# Altium footprint library mastermind.PCBLIB: 1061 footprints (part 61 of 67)
Each footprint in its own frame and in the unit in brackets; x right, y up, seen from the top. Pads: shape width x height; smd on the part's side, far side on the other; paste and mask are expansions set on the pad; w line width, h text height; cw(c..) or ccw(c..) is an arc to the next point about the centre after c.
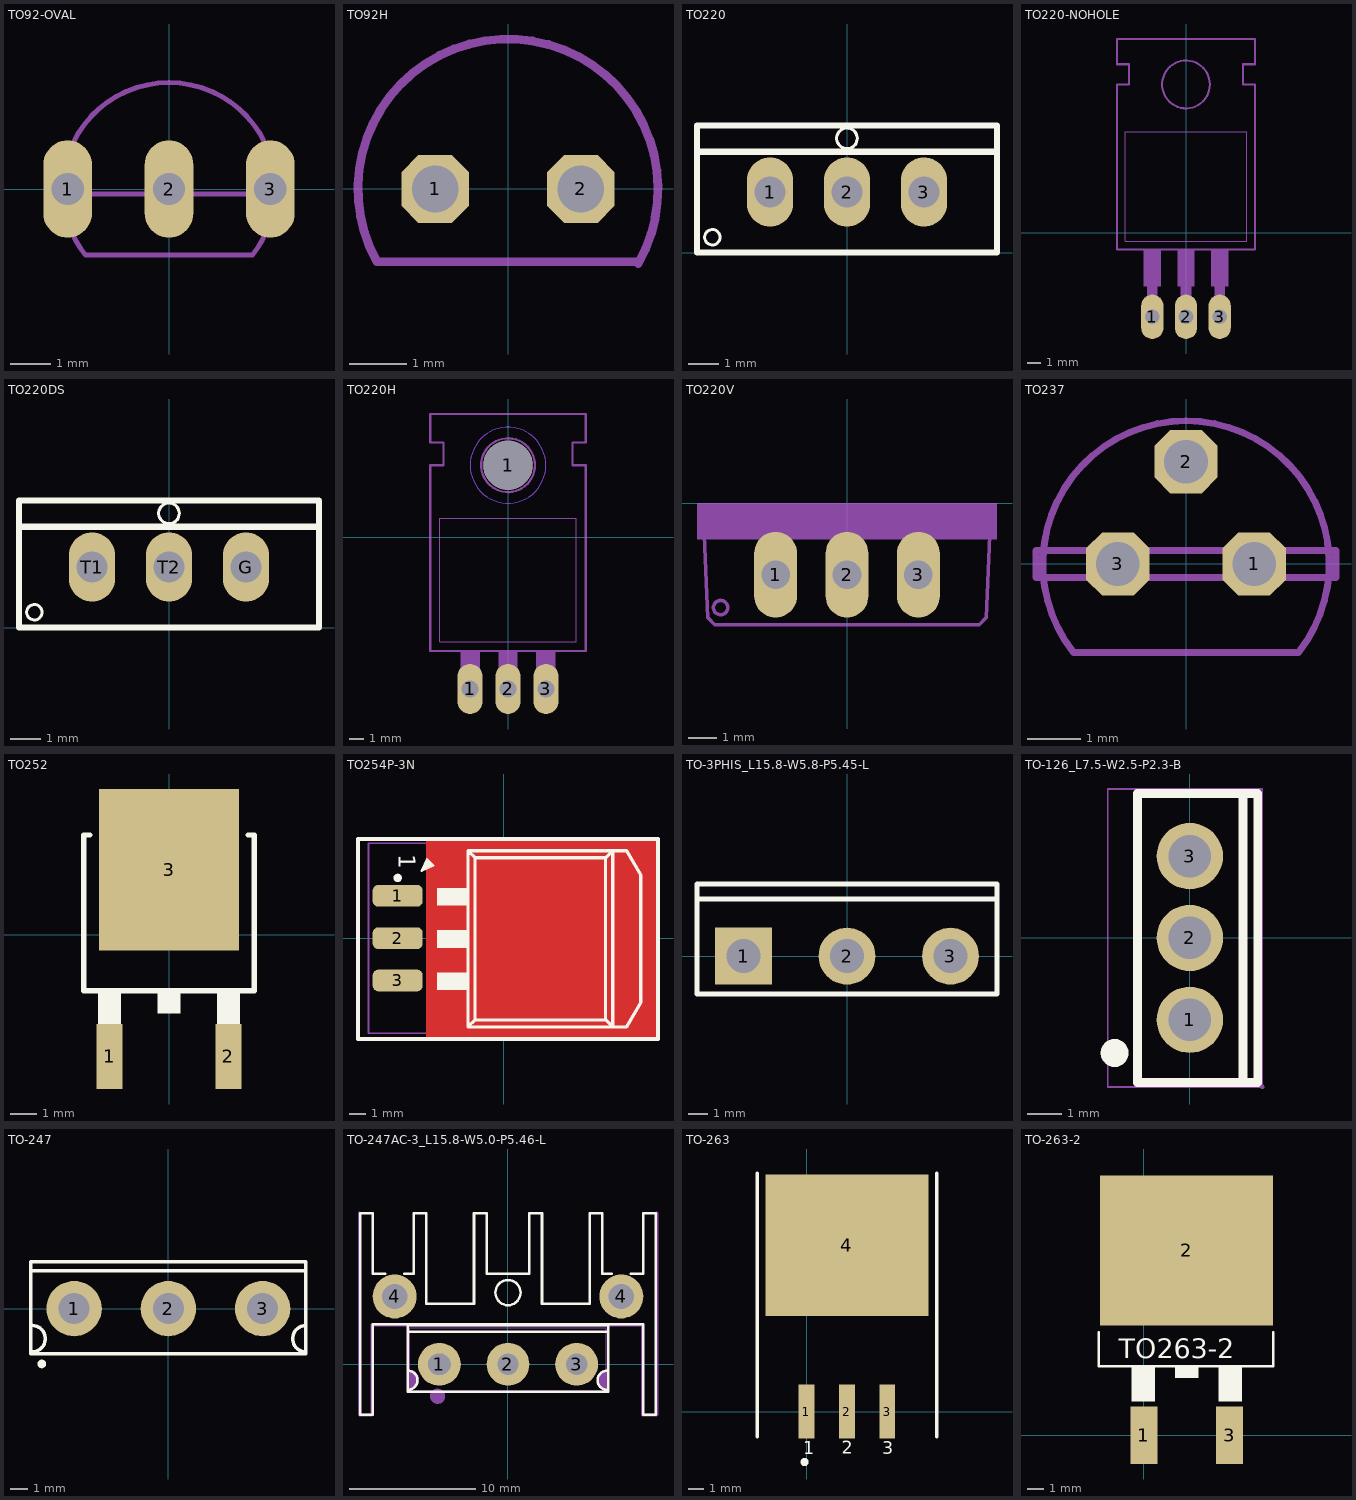
[diagram p60: the footprints below, top view; thin cyan lines are the x and y axes]

## TO92-OVAL [mil]
pads (3):
  oval 48x96 hole 32: 1(-100,0) 2(0,0) 3(100,0)
Mechanical 2:
  lines w5: -95.02,-44.72 ccw(c-0.02,0.01) -82.48,-65 82.48,-65 ccw(c0.01,0) 95.46,-43.77 ; -95,44.72 cw(c0,0) 95,44.72 ; -55.28,-5 -44.72,-5 ; 44.72,-5 55.28,-5
Mechanical 8:
  lines w5: -104.88,-5 -55.28,-5 ; -95,-44.72 cw(c0,0) -95,44.72 ; -44.72,-5 44.72,-5 ; 55.28,-5 104.88,-5 ; 95,-44.72 ccw(c0,0) 95,44.72

## TO92H [mil]
pads (2):
  oct 46.48x46.48 hole 32: 1(-50,0) 2(50,0)
Mechanical 2:
  lines w6: 89.39,-51.08 ccw(c0,0) -90,-50 90,-50

## TO220 [mil]
pads (3):
  oval 60x90 hole 40: 1(-100,78.74) 2(0,78.74) 3(100,78.74)
Top Overlay:
  circle w3.94: c-175,20 r10
  circle w3.94: c0,148.5 r13.39
  lines w7.87: -192.91,131.1 192.91,131.1 ; -194.88,0 194.88,0 194.88,165.35 -194.88,165.35 -194.88,0
3D body "TO220ShortLegs.STEP": height 767.72, standoff -137.8, extent -203.15,0 203.15,171.26

## TO220-NOHOLE [mil]
pads (3):
  oval 66x132 hole 44: 1(-100,-250) 2(0,-250) 3(100,-250)
Mechanical 2:
  circle w6: c0,440 r71
  region: 85,-185 85,-160 115,-160 115,-185
  region: -15,-185 -15,-160 15,-160 15,-185
  region: -115,-185 -115,-160 -85,-160 -85,-185
  region: -125,-160 -125,-50 -75,-50 -75,-160
  region: -25,-160 -25,-50 25,-50 25,-160
  region: 75,-160 75,-50 125,-50 125,-160
  lines w2: -180,-25 180,-25 180,300 -180,300 -180,-25
  lines w6: -205,-50 205,-50 205,440 170,440 170,500 205,500 205,575 -205,575 -205,500 -170,500 -170,440 -205,440 -205,-50
Mechanical 8:
  region: -115,-260 -115,-185 -85,-185 -85,-260
  region: -15,-260 -15,-185 15,-185 15,-260
  region: 85,-260 85,-185 115,-185 115,-260

## TO220DS [mil]
pads (3):
  oval 60x90 hole 40: G(100,78.74) T1(-100,78.74) T2(0,78.74)
Top Overlay:
  circle w3.94: c0,148.5 r13.39
  circle w3.94: c-175,20 r10
  lines w7.87: -192.91,131.1 192.91,131.1 ; -194.88,0 -194.88,165.35 194.88,165.35 194.88,0 -194.88,0
3D body "HeatsinkTO220 (1).step": height 787.4, standoff 0, extent -295.28,3.94 295.28,437.01

## TO220H [mil]
pads (4):
  oval 66x132 hole 44: 1(-100,-400) 2(0,-400) 3(100,-400)
  round 130 hole 130: 1(0,190)
Top Layer keep-out:
  circle w0: c0,190 r100
Bottom Layer keep-out:
  circle w0: c0,190 r100
Mechanical 2:
  circle w6: c0,190 r71
  region: 85,-435 85,-410 115,-410 115,-435
  region: -15,-435 -15,-410 15,-410 15,-435
  region: -115,-435 -115,-410 -85,-410 -85,-435
  region: -125,-410 -125,-300 -75,-300 -75,-410
  region: -25,-410 -25,-300 25,-300 25,-410
  region: 75,-410 75,-300 125,-300 125,-410
  lines w2: -180,-275 180,-275 180,50 -180,50 -180,-275
  lines w6: -205,-300 205,-300 205,190 170,190 170,250 205,250 205,325 -205,325 -205,250 -170,250 -170,190 -205,190 -205,-300

## TO220V [mil]
pads (3):
  oval 60x120 hole 40: 1(-100,-100) 2(0,-100) 3(100,-100)
Mechanical 2:
  circle w5: c-177,-146 r10
  region: -210,-30 -210,0 210,0 210,-30
  region: -210,-50 -210,-30 -135,-30 -135,-50
  region: -65,-50 -65,-30 -35,-30 -35,-50
  region: 35,-50 35,-30 65,-30 65,-50
  region: 135,-50 135,-30 210,-30 210,-50
  lines w5: -200,-45 -195,-160 -185,-170 185,-170 195,-160 200,-45
Mechanical 8:
  region: -135,-50 -135,-30 -65,-30 -65,-50
  region: -35,-50 -35,-30 35,-30 35,-50
  region: 65,-50 65,-30 135,-30 135,-50

## TO237 [mil]
pads (3):
  oct 46.48x46.48 hole 32: 1(50,0) 2(0,75) 3(-50,0)
Mechanical 2:
  lines w5: -30.96,100.33 ccw(c0,0) -82.46,-65 82.46,-65 ccw(c0,0) 30.96,100.33 ; -110,-10 110,-10 110,10 -110,10 -110,-10
Mechanical 8:
  lines w5: -30.96,100.33 cw(c0,-0.02) 30.96,100.33

## TO252 [mm]
pads (3):
  rect 1x2.5 smd: 1(-2.28,-4.681) 2(2.28,-4.681)
  rect 5.4x6.2 smd: 3(0,2.5)
Top Overlay:
  region: -0.432,-3.023 -0.432,-2.261 0.432,-2.261 0.432,-3.023
  region: 1.854,-3.683 1.854,-2.261 2.718,-2.261 2.718,-3.683
  region: -2.718,-3.683 -2.718,-2.261 -1.854,-2.261 -1.854,-3.683
  lines w0.203: -3.048,3.835 -3.277,3.835 -3.277,-2.159 3.277,-2.159 3.277,3.835 3.048,3.835
3D body "User Library-TO252-2.STEP": height 2.29, standoff 0, extent -3.29,-5.028 3.29,4.912

## TO254P-3N [mm]
pads (3):
  rrect50% 3x1.3 smd: 1(-6.35,2.54) 2(-6.35,0) 3(-6.35,-2.54)
Top Layer:
  region: -4.639,5.949 -4.639,-6.051 9.253,-6.051 9.253,5.949
Top Overlay:
  circle w0.25: c-6.35,3.615 r0.125
  region: -3.988,3.023 -3.988,1.956 -2.108,1.956 -2.108,3.023
  region: -3.988,-2.057 -3.988,-3.124 -2.108,-3.124 -2.108,-2.057
  region: -3.988,0.483 -3.988,-0.584 -2.108,-0.584 -2.108,0.483
  lines w0.127: -4.919,4.028 -4.208,4.358 -4.4,4.547 ; -4.919,4.028 -4.589,4.739 -4.4,4.547 ; -4.919,4.028 -4.4,4.547
  lines w0.178: -4.716,4.383 -4.538,4.561 ; -4.564,4.231 -4.386,4.409
  lines w0.2: -2.134,-5.329 -2.134,5.254 ; -2.134,-5.329 6.545,-5.329 ; -2.134,-5.329 -1.71,-4.906 ; -2.134,5.254 6.545,5.254 ; -2.134,5.254 -1.71,4.831 ; -1.71,-4.906 6.121,-4.906 ; -1.71,-4.906 -1.71,4.831 ; -1.71,4.831 6.121,4.831 ; 6.121,-4.906 6.121,4.831 ; 6.121,-4.906 6.545,-5.329 ; 6.121,4.831 6.545,5.254 ; 6.545,-5.329 6.545,5.254 ; 6.545,-5.329 7.366,-5.329 8.238,-3.847 8.238,3.773 7.366,5.254 6.545,5.254
  lines w0.254: -8.731,-6.051 9.269,-6.051 9.269,5.949 -8.731,5.949 -8.731,-6.051
  text "1" at -6.299,5.026 h1
Top Paste:
  region: -0.431,3.773 -0.431,-3.847 7.595,-3.847 7.595,3.773
Top Solder:
  region: -2.413,5.5 -2.413,-5.625 8.179,-5.625 8.179,5.5
  lines w0.254: 8.554,-3.938 8.131,-5.419 ; 8.554,3.863 8.131,5.344 ; -2.462,-5.329 ccw(c-2.134,-5.329) -2.134,-5.658 ; -2.462,-5.329 ccw(c-2.134,-5.329) -2.134,-5.658 ; -2.462,-5.329 -2.462,5.254 ; -2.462,5.254 cw(c-2.134,5.254) -2.134,5.583 ; -2.462,5.254 cw(c-2.134,5.254) -2.134,5.583 ; -2.134,-5.658 6.545,-5.658 7.815,-5.658 ; -2.134,5.583 6.545,5.583 7.815,5.583 ; 7.815,-5.658 ccw(c7.815,-5.329) 8.131,-5.42 ; 7.815,-5.658 ccw(c7.815,-5.329) 8.131,-5.42 ; 7.815,5.583 cw(c7.815,5.254) 8.131,5.345 ; 7.815,5.583 cw(c7.815,5.254) 8.131,5.345 ; 8.567,-3.847 cw(c8.238,-3.847) 8.554,-3.938 ccw(c8.238,-3.847) 8.567,-3.847 ; 8.567,-3.847 8.567,3.773 ; 8.567,3.773 ccw(c8.238,3.773) 8.554,3.863 cw(c8.238,3.773) 8.567,3.773
  lines w0.508: 8.196,-4.669 8.196,4.577
Mechanical 13:
  lines w0.1: -2.675,-4.985 -2.675,4.985 6.475,4.985 6.475,-4.985 -2.675,-4.985
Mechanical 15:
  lines w0.1: -0.5,0 0.5,0 ; 0,-0.5 0,0.5 ; -8.1,-5.7 -8.1,5.7 8.1,5.7 8.1,-5.7 -8.1,-5.7
3D body "254-3.STEP": height 2.53, standoff -0.02, extent -7.339,-5.087 8.101,5.08

## TO-3PHIS_L15.8-W5.8-P5.45-L [mm]
pads (3):
  rect 3x3 hole 1.8 paste-2539.97 mask+0.051: 1(-5.451,0)
  round 3 hole 1.8 paste-2539.97 mask+0.051: 2(0,0) 3(5.451,0)
Top Overlay:
  lines w0.254: -7.9,3 7.9,3 ; -7.9,-2 7.9,-2 7.9,3.8 -7.9,3.8 -7.9,-2

## TO-126_L7.5-W2.5-P2.3-B [mil]
pads (3):
  round 75 hole 48 paste-99999 mask+2: 1(0,-92.52) 2(0,0) 3(0,92.52)
Top Overlay:
  lines w10: 60,-160 60,160 ; -59.05,-163.38 76.78,-163.38 76.78,163.39 -59.05,163.39 -59.05,-163.38
  lines w15.75: -77.12,-130.05 cw(c-85,-130) -77.12,-129.95
Mechanical 15:
  region: 20.06,92.52 20.06,96.51 17.01,103.88 11.36,109.53 3.99,112.58 -3.99,112.58 -11.37,109.53 -17.01,103.88 -20.06,96.51 -20.06,92.52 -20.06,88.53 -17.01,81.15 -11.36,75.51 -3.99,72.46 3.99,72.46 11.37,75.51 17.01,81.16 20.06,88.53
  region: 20.06,0 20.06,3.99 17.01,11.36 11.36,17.01 3.99,20.06 -3.99,20.06 -11.37,17.01 -17.01,11.36 -20.06,3.99 -20.06,0 -20.06,-3.99 -17.01,-11.37 -11.36,-17.01 -3.99,-20.06 3.99,-20.06 11.37,-17.01 17.01,-11.36 20.06,-3.99
  region: 20.06,-92.52 20.06,-88.53 17.01,-81.16 11.36,-75.51 3.99,-72.46 -3.99,-72.46 -11.37,-75.51 -17.01,-81.16 -20.06,-88.53 -20.06,-92.52 -20.06,-96.51 -17.01,-103.89 -11.36,-109.53 -3.99,-112.58 3.99,-112.58 11.37,-109.53 17.01,-103.88 20.06,-96.51
  region: 84.14,-168.38 84.14,-167.4 82.76,-166.02 80.8,-166.02 79.42,-167.4 79.42,-168.38 79.42,-169.36 80.8,-170.74 82.76,-170.74 84.14,-169.36
  lines w2: -92.87,-168.38 81.78,-168.38 81.78,168.39 -92.87,168.39 -92.87,-168.38
3D body "??-27(TO-126).STEP": height 590.45, standoff -98.43, extent -53.2,-157.38 57.03,157.38

## TO-247 [mm] "SIP with Mounting Hole; 3 Leads; Body 20 x 15.6 x 5 mm (typ); Pitch 5.45 mm"
height 24.6
pads (3):
  round 3.2 / inner round 4 / far side round 4 hole 1.8: 1(-5.45,0) 2(0,0) 3(5.45,0)
Top Overlay:
  circle w0.25: c-7.32,-3.2 r0.125
  lines w0.2: -7.95,2.2 7.95,2.2 ; -7.875,-2.499 ccw(c-7.875,-1.737) -7.875,-0.975 ; 7.95,-2.502 cw(c7.95,-1.74) 7.95,-0.978 ; -7.95,-2.6 -7.95,2.7 7.95,2.7 7.95,-2.6 -7.95,-2.6
Mechanical 13:
  lines w0.1: -7.95,-2.6 -7.95,2.7 7.95,2.7 7.95,-2.6 -7.95,-2.6
Mechanical 15:
  lines w0.1: -0.5,0 0.5,0 ; 0,-0.5 0,0.5
3D body "TO-247.stp": height 23.3, standoff -10.75, extent -7.595,-2.502 7.855,2.358

## TO-247AC-3_L15.8-W5.0-P5.46-L [mm]
pads (5):
  round 3.4 hole 1.7 slot 1.785 at 0 deg paste-2539.97 mask+0.051: 1(-5.45,0)
  round 3.4 hole 1.7 paste-2539.97 mask+0.051: 2(0,0) 3(5.45,0)
  round 3.5 hole 2 paste-2539.97 mask+0.05: 4(-8.999,5.389) 4(9.001,5.389)
Top Overlay:
  lines w0.2: -9.756,7.189 -10.75,7.189 -10.75,11.989 -11.75,11.989 -11.75,-4.011 -10.75,-4.011 -10.75,3.189 10.75,3.189 10.75,-4.011 11.75,-4.011 11.75,11.989 10.75,11.989 10.75,7.189 9.757,7.189 ; -9.004,4.589 cw(c-9.002,5.389) -9,4.589 ; -8.243,7.189 -7.5,7.189 -7.5,11.989 -6.5,11.989 -6.5,4.789 -2.7,4.789 -2.7,11.989 -1.7,11.989 -1.7,7.189 1.7,7.189 1.7,11.989 2.7,11.989 2.7,4.789 6.5,4.789 6.5,11.989 7.5,11.989 7.5,7.189 8.244,7.189 ; -7.951,-2.029 ccw(c-7.951,-1.267) -7.951,-0.505 ; -7.951,2.6 7.95,2.6 ; -0.005,4.689 cw(c-0.002,5.689) 0,4.689 ; 7.874,-2.032 cw(c7.874,-1.27) 7.874,-0.508 ; -7.951,-2.201 7.95,-2.201 7.95,3.1 -7.951,3.1 -7.951,-2.201
Mechanical 6:
  circle w0.6: c-5.588,-2.54 r0.3
  region: 7.873,-0.432 7.767,-0.432 7.564,-0.486 7.382,-0.592 7.233,-0.741 7.127,-0.923 7.073,-1.127 7.073,-1.337 7.127,-1.541 7.233,-1.723 7.382,-1.872 7.564,-1.977 7.767,-2.032 7.873,-2.032
  region: -7.874,-2.032 -7.769,-2.032 -7.565,-1.977 -7.383,-1.872 -7.234,-1.723 -7.129,-1.541 -7.074,-1.337 -7.074,-1.127 -7.129,-0.923 -7.234,-0.741 -7.383,-0.592 -7.565,-0.487 -7.769,-0.432 -7.874,-0.432
Mechanical 15:
  region: 4.845,0.312 6.055,0.312 6.055,-0.312 4.845,-0.312
  region: -0.605,0.312 0.605,0.312 0.605,-0.312 -0.605,-0.312
  region: -6.055,0.312 -4.845,0.312 -4.845,-0.312 -6.055,-0.312
  region: -7.814,-2.19 -7.814,-2.166 -7.849,-2.131 -7.898,-2.131 -7.933,-2.166 -7.934,-2.19 -7.933,-2.214 -7.898,-2.249 -7.849,-2.249 -7.814,-2.214
  region: -10.694,-3.882 -10.694,-4.009 -10.694,-4.029 -10.71,-4.066 -10.738,-4.094 -10.775,-4.109 -10.794,-4.109 -11.81,-4.109 -11.83,-4.109 -11.867,-4.094 -11.895,-4.066 -11.91,-4.029 -11.91,-4.009 -11.91,11.993 -11.91,12.034 -11.852,12.093 -11.769,12.093 -11.71,12.034 -11.71,11.993 -11.71,-3.909 -10.894,-3.909 -10.894,-3.882 -10.894,-3.841 -10.836,-3.782 -10.753,-3.782 -10.694,-3.841
  region: -10.894,-3.882 -10.894,3.103 -10.894,3.123 -10.879,3.16 -10.851,3.188 -10.814,3.203 -10.794,3.203 10.669,3.203 10.688,3.203 10.725,3.188 10.753,3.16 10.769,3.123 10.769,3.103 10.769,-3.909 11.712,-3.909 11.712,11.993 11.712,12.034 11.77,12.093 11.853,12.093 11.912,12.034 11.912,11.993 11.912,-4.009 11.912,-4.029 11.896,-4.066 11.868,-4.094 11.831,-4.109 11.812,-4.109 10.669,-4.109 10.649,-4.109 10.612,-4.094 10.584,-4.066 10.569,-4.029 10.569,-4.009 10.569,3.003 -10.694,3.003 -10.694,-3.882 -10.694,-3.923 -10.753,-3.982 -10.836,-3.982 -10.894,-3.923
  lines w0.051: -7.8,-2.1 7.8,-2.1 7.8,2.9 -7.8,2.9 -7.8,-2.1
3D body "TO-247.stp": height 23.3, standoff -10.75, extent -7.725,-2.25 7.725,2.61
3D body "heatsink for the transistor in the case TO-220.STEP": height 26.6, standoff -2.4, extent -11.4,-4.8 11.6,12.2

## TO-263 [mm]
pads (4):
  rect 1x3.4 smd: 1(-0.006,0.009) 2(2.534,0.009) 3(5.074,0.009)
  rect 10.25x8.9 smd: 4(2.534,10.459)
Top Overlay:
  circle w0.25: c-0.126,-3.166 r0.125
  lines w0.2: -3.106,-1.591 -3.106,15.009 ; 8.194,-1.591 8.194,15.009
  text "2" at 2.213,-2.653 h0.8
  text "3" at 4.774,-2.691 h0.8
  text "1" at -0.201,-2.666 h0.8
3D body "to263-3_p5-08_l10-414_w4-826.stp": height 4.83, standoff -0.01, extent -2.673,-0.752 7.741,15.047

## TO-263-2 [mm]
pads (3):
  rect 1.6x3.4 smd: 1(-0.006,0.009) 3(5.074,0.009)
  rect 10.25x8.9 smd: 2(2.534,10.959)
Top Overlay:
  rectangle: 1.849,3.39 3.245,4.123
  rectangle: -0.726,2.003 0.67,4.123
  rectangle: 4.424,2.003 5.82,4.123
  lines w0.152: -2.673,6.1 -2.673,4.1 7.659,4.1 7.659,6.1
  text "TO263-2" at -1.5,4.2 h2
3D body "to263-3_p5-08_l10-414_w4-826.stp": height 4.83, standoff -0.01, extent -2.673,-0.752 7.741,15.047